# Altium footprint library ST封装.PcbLib: 1336 footprints (part 103 of 109)
Each footprint in its own frame and in the unit in brackets; x right, y up, seen from the top. Pads: shape width x height; smd on the part's side, far side on the other; paste and mask are expansions set on the pad; w line width, h text height; cw(c..) or ccw(c..) is an arc to the next point about the centre after c.
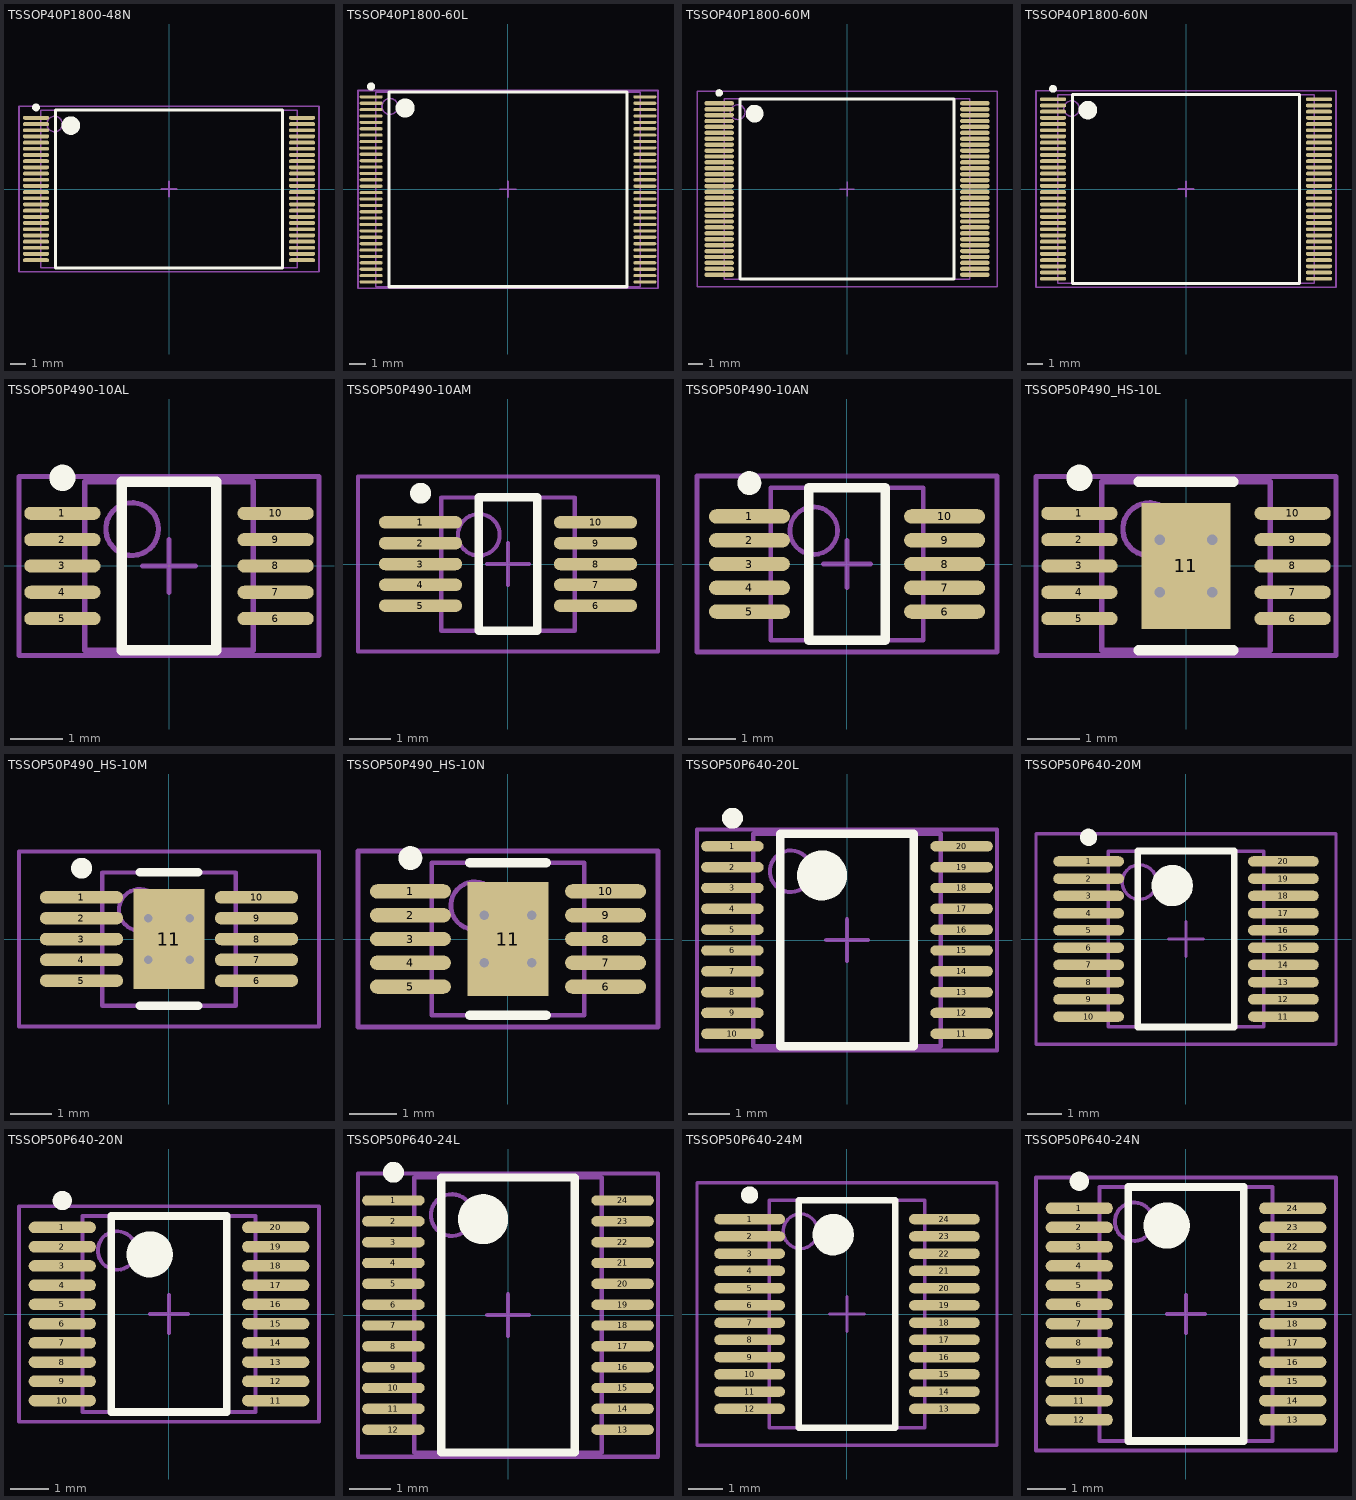
[diagram p102: the footprints below, top view; thin cyan lines are the x and y axes]

## TSSOP40P1800-48N [mm] "TSSOP, 48-Leads, Body 10x16.4mm, Pitch 0.4mm, IPC Medium Density"
height 1.27
pads (48):
  oval 1.7x0.25 smd: 1(-8.6,4.6) 2(-8.6,4.2) 3(-8.6,3.8) 4(-8.6,3.4) 5(-8.6,3) 6(-8.6,2.6) 7(-8.6,2.2) 8(-8.6,1.8) 9(-8.6,1.4) 10(-8.6,1) 11(-8.6,0.6) 12(-8.6,0.2) 13(-8.6,-0.2) 14(-8.6,-0.6) 15(-8.6,-1) 16(-8.6,-1.4) 17(-8.6,-1.8) 18(-8.6,-2.2) 19(-8.6,-2.6) 20(-8.6,-3) 21(-8.6,-3.4) 22(-8.6,-3.8) 23(-8.6,-4.2) 24(-8.6,-4.6) 25(8.6,-4.6) 26(8.6,-4.2) 27(8.6,-3.8) 28(8.6,-3.4) 29(8.6,-3) 30(8.6,-2.6) 31(8.6,-2.2) 32(8.6,-1.8) 33(8.6,-1.4) 34(8.6,-1) 35(8.6,-0.6) 36(8.6,-0.2) 37(8.6,0.2) 38(8.6,0.6) 39(8.6,1) 40(8.6,1.4) 41(8.6,1.8) 42(8.6,2.2) 43(8.6,2.6) 44(8.6,3) 45(8.6,3.4) 46(8.6,3.8) 47(8.6,4.2) 48(8.6,4.6)
Top Overlay:
  circle w0.6: c-6.35,4.1 r0.3
  circle w0.25: c-8.6,5.275 r0.125
  lines w0.2: -7.35,-5.1 7.35,-5.1 7.35,5.1 -7.35,5.1 -7.35,-5.1
Mechanical 13:
  circle w0.1: c-7.4,4.2 r0.5
  lines w0.1: -8.3,-5.1 8.3,-5.1 8.3,5.1 -8.3,5.1 -8.3,-5.1
Mechanical 15:
  lines w0.1: -0.5,0 0.5,0 ; 0,-0.5 0,0.5 ; -9.7,-5.35 9.7,-5.35 9.7,5.35 -9.7,5.35 -9.7,-5.35
3D body: height 1.27, standoff 0, extent -8.3,-5.1 8.3,5.1

## TSSOP40P1800-60L [mm] "TSSOP, 60-Leads, Body 12x16.4mm, Pitch 0.4mm, IPC High Density"
height 1.27
pads (60):
  oval 1.45x0.2 smd: 1(-8.575,5.8) 2(-8.575,5.4) 3(-8.575,5) 4(-8.575,4.6) 5(-8.575,4.2) 6(-8.575,3.8) 7(-8.575,3.4) 8(-8.575,3) 9(-8.575,2.6) 10(-8.575,2.2) 11(-8.575,1.8) 12(-8.575,1.4) 13(-8.575,1) 14(-8.575,0.6) 15(-8.575,0.2) 16(-8.575,-0.2) 17(-8.575,-0.6) 18(-8.575,-1) 19(-8.575,-1.4) 20(-8.575,-1.8) 21(-8.575,-2.2) 22(-8.575,-2.6) 23(-8.575,-3) 24(-8.575,-3.4) 25(-8.575,-3.8) 26(-8.575,-4.2) 27(-8.575,-4.6) 28(-8.575,-5) 29(-8.575,-5.4) 30(-8.575,-5.8) 31(8.575,-5.8) 32(8.575,-5.4) 33(8.575,-5) 34(8.575,-4.6) 35(8.575,-4.2) 36(8.575,-3.8) 37(8.575,-3.4) 38(8.575,-3) 39(8.575,-2.6) 40(8.575,-2.2) 41(8.575,-1.8) 42(8.575,-1.4) 43(8.575,-1) 44(8.575,-0.6) 45(8.575,-0.2) 46(8.575,0.2) 47(8.575,0.6) 48(8.575,1) 49(8.575,1.4) 50(8.575,1.8) 51(8.575,2.2) 52(8.575,2.6) 53(8.575,3) 54(8.575,3.4) 55(8.575,3.8) 56(8.575,4.2) 57(8.575,4.6) 58(8.575,5) 59(8.575,5.4) 60(8.575,5.8)
Top Overlay:
  circle w0.25: c-8.575,6.45 r0.125
  circle w0.6: c-6.45,5.1 r0.3
  lines w0.2: -7.45,-6.1 -7.45,6.1 7.45,6.1 7.45,-6.1 -7.45,-6.1
Mechanical 13:
  circle w0.1: c-7.4,5.2 r0.5
  lines w0.1: -8.3,-6.1 -8.3,6.1 8.3,6.1 8.3,-6.1 -8.3,-6.1
Mechanical 15:
  lines w0.1: -0.5,0 0.5,0 ; 0,-0.5 0,0.5 ; -9.4,-6.2 -9.4,6.2 9.4,6.2 9.4,-6.2 -9.4,-6.2
3D body: height 1.27, standoff 0, extent -8.3,-6.1 8.3,6.1

## TSSOP40P1800-60M [mm] "TSSOP, 60-Leads, Body 12x16.4mm, Pitch 0.4mm, IPC Low Density"
height 1.27
pads (60):
  oval 2x0.3 smd: 1(-8.65,5.8) 2(-8.65,5.4) 3(-8.65,5) 4(-8.65,4.6) 5(-8.65,4.2) 6(-8.65,3.8) 7(-8.65,3.4) 8(-8.65,3) 9(-8.65,2.6) 10(-8.65,2.2) 11(-8.65,1.8) 12(-8.65,1.4) 13(-8.65,1) 14(-8.65,0.6) 15(-8.65,0.2) 16(-8.65,-0.2) 17(-8.65,-0.6) 18(-8.65,-1) 19(-8.65,-1.4) 20(-8.65,-1.8) 21(-8.65,-2.2) 22(-8.65,-2.6) 23(-8.65,-3) 24(-8.65,-3.4) 25(-8.65,-3.8) 26(-8.65,-4.2) 27(-8.65,-4.6) 28(-8.65,-5) 29(-8.65,-5.4) 30(-8.65,-5.8) 31(8.65,-5.8) 32(8.65,-5.4) 33(8.65,-5) 34(8.65,-4.6) 35(8.65,-4.2) 36(8.65,-3.8) 37(8.65,-3.4) 38(8.65,-3) 39(8.65,-2.6) 40(8.65,-2.2) 41(8.65,-1.8) 42(8.65,-1.4) 43(8.65,-1) 44(8.65,-0.6) 45(8.65,-0.2) 46(8.65,0.2) 47(8.65,0.6) 48(8.65,1) 49(8.65,1.4) 50(8.65,1.8) 51(8.65,2.2) 52(8.65,2.6) 53(8.65,3) 54(8.65,3.4) 55(8.65,3.8) 56(8.65,4.2) 57(8.65,4.6) 58(8.65,5) 59(8.65,5.4) 60(8.65,5.8)
Top Overlay:
  circle w0.25: c-8.65,6.5 r0.125
  circle w0.6: c-6.25,5.1 r0.3
  lines w0.2: -7.25,-6.1 -7.25,6.1 7.25,6.1 7.25,-6.1 -7.25,-6.1
Mechanical 13:
  circle w0.1: c-7.4,5.2 r0.5
  lines w0.1: -8.3,-6.1 -8.3,6.1 8.3,6.1 8.3,-6.1 -8.3,-6.1
Mechanical 15:
  lines w0.1: -0.5,0 0.5,0 ; 0,-0.5 0,0.5 ; -10.15,-6.6 -10.15,6.6 10.15,6.6 10.15,-6.6 -10.15,-6.6
3D body: height 1.27, standoff 0, extent -8.3,-6.1 8.3,6.1

## TSSOP40P1800-60N [mm] "TSSOP, 60-Leads, Body 12x16.4mm, Pitch 0.4mm, IPC Medium Density"
height 1.27
pads (60):
  oval 1.7x0.25 smd: 1(-8.6,5.8) 2(-8.6,5.4) 3(-8.6,5) 4(-8.6,4.6) 5(-8.6,4.2) 6(-8.6,3.8) 7(-8.6,3.4) 8(-8.6,3) 9(-8.6,2.6) 10(-8.6,2.2) 11(-8.6,1.8) 12(-8.6,1.4) 13(-8.6,1) 14(-8.6,0.6) 15(-8.6,0.2) 16(-8.6,-0.2) 17(-8.6,-0.6) 18(-8.6,-1) 19(-8.6,-1.4) 20(-8.6,-1.8) 21(-8.6,-2.2) 22(-8.6,-2.6) 23(-8.6,-3) 24(-8.6,-3.4) 25(-8.6,-3.8) 26(-8.6,-4.2) 27(-8.6,-4.6) 28(-8.6,-5) 29(-8.6,-5.4) 30(-8.6,-5.8) 31(8.6,-5.8) 32(8.6,-5.4) 33(8.6,-5) 34(8.6,-4.6) 35(8.6,-4.2) 36(8.6,-3.8) 37(8.6,-3.4) 38(8.6,-3) 39(8.6,-2.6) 40(8.6,-2.2) 41(8.6,-1.8) 42(8.6,-1.4) 43(8.6,-1) 44(8.6,-0.6) 45(8.6,-0.2) 46(8.6,0.2) 47(8.6,0.6) 48(8.6,1) 49(8.6,1.4) 50(8.6,1.8) 51(8.6,2.2) 52(8.6,2.6) 53(8.6,3) 54(8.6,3.4) 55(8.6,3.8) 56(8.6,4.2) 57(8.6,4.6) 58(8.6,5) 59(8.6,5.4) 60(8.6,5.8)
Top Overlay:
  circle w0.25: c-8.6,6.475 r0.125
  circle w0.6: c-6.35,5.1 r0.3
  lines w0.2: -7.35,-6.1 -7.35,6.1 7.35,6.1 7.35,-6.1 -7.35,-6.1
Mechanical 13:
  circle w0.1: c-7.4,5.2 r0.5
  lines w0.1: -8.3,-6.1 -8.3,6.1 8.3,6.1 8.3,-6.1 -8.3,-6.1
Mechanical 15:
  lines w0.1: -0.5,0 0.5,0 ; 0,-0.5 0,0.5 ; -9.7,-6.35 -9.7,6.35 9.7,6.35 9.7,-6.35 -9.7,-6.35
3D body: height 1.27, standoff 0, extent -8.3,-6.1 8.3,6.1

## TSSOP50P490-10AL [mm] "TSSOP, 10-Leads, Body 3x3mm, Pitch 0.5mm, IPC High Density"
height 1.1
pads (10):
  oval 1.45x0.25 smd: 1(-2.025,1) 2(-2.025,0.5) 3(-2.025,0) 4(-2.025,-0.5) 5(-2.025,-1) 6(2.025,-1) 7(2.025,-0.5) 8(2.025,0) 9(2.025,0.5) 10(2.025,1)
Top Overlay:
  circle w0.25: c-2.025,1.675 r0.125
  lines w0.2: -0.9,-1.6 0.9,-1.6 0.9,1.6 -0.9,1.6 -0.9,-1.6
Mechanical 13:
  circle w0.1: c-0.7,0.7 r0.5
  lines w0.1: -1.6,-1.6 1.6,-1.6 1.6,1.6 -1.6,1.6 -1.6,-1.6
Mechanical 15:
  lines w0.1: -0.5,0 0.5,0 ; 0,-0.5 0,0.5 ; -2.85,-1.7 2.85,-1.7 2.85,1.7 -2.85,1.7 -2.85,-1.7
3D body: height 1.1, standoff 0, extent -1.6,-1.6 1.6,1.6

## TSSOP50P490-10AM [mm] "TSSOP, 10-Leads, Body 3x3mm, Pitch 0.5mm, IPC Low Density"
height 1.1
pads (10):
  oval 2x0.3 smd: 1(-2.1,1) 2(-2.1,0.5) 3(-2.1,0) 4(-2.1,-0.5) 5(-2.1,-1) 6(2.1,-1) 7(2.1,-0.5) 8(2.1,0) 9(2.1,0.5) 10(2.1,1)
Top Overlay:
  circle w0.25: c-2.1,1.7 r0.125
  lines w0.2: -0.7,-1.6 -0.7,1.6 0.7,1.6 0.7,-1.6 -0.7,-1.6
Mechanical 13:
  circle w0.1: c-0.7,0.7 r0.5
  lines w0.1: -1.6,-1.6 -1.6,1.6 1.6,1.6 1.6,-1.6 -1.6,-1.6
Mechanical 15:
  lines w0.1: -0.5,0 0.5,0 ; 0,-0.5 0,0.5 ; -3.6,-2.1 -3.6,2.1 3.6,2.1 3.6,-2.1 -3.6,-2.1
3D body: height 1.1, standoff 0, extent -1.6,-1.6 1.6,1.6

## TSSOP50P490-10AN [mm] "TSSOP, 10-Leads, Body 3x3mm, Pitch 0.5mm, IPC Medium Density"
height 1.1
pads (10):
  oval 1.7x0.3 smd: 1(-2.05,1) 2(-2.05,0.5) 3(-2.05,0) 4(-2.05,-0.5) 5(-2.05,-1) 6(2.05,-1) 7(2.05,-0.5) 8(2.05,0) 9(2.05,0.5) 10(2.05,1)
Top Overlay:
  circle w0.25: c-2.05,1.7 r0.125
  lines w0.2: -0.8,-1.6 -0.8,1.6 0.8,1.6 0.8,-1.6 -0.8,-1.6
Mechanical 13:
  circle w0.1: c-0.7,0.7 r0.5
  lines w0.1: -1.6,-1.6 -1.6,1.6 1.6,1.6 1.6,-1.6 -1.6,-1.6
Mechanical 15:
  lines w0.1: -0.5,0 0.5,0 ; 0,-0.5 0,0.5 ; -3.15,-1.85 -3.15,1.85 3.15,1.85 3.15,-1.85 -3.15,-1.85
3D body: height 1.1, standoff 0, extent -1.6,-1.6 1.6,1.6

## TSSOP50P490_HS-10L [mm] "TSSOP, 10-Leads, Body 3x3mm, Pitch 0.5mm, Exposed Pad, IPC High Density"
height 1.1
pads (11):
  oval 1.45x0.25 smd: 1(-2.025,1) 2(-2.025,0.5) 3(-2.025,0) 4(-2.025,-0.5) 5(-2.025,-1) 6(2.025,-1) 7(2.025,-0.5) 8(2.025,0) 9(2.025,0.5) 10(2.025,1)
  rect 1.7x2.4 smd: 11(0,0)
via -0.5,0.5 diameter 0.4 hole 0.2
via 0.5,0.5 diameter 0.4 hole 0.2
via -0.5,-0.5 diameter 0.4 hole 0.2
via 0.5,-0.5 diameter 0.4 hole 0.2
Top Overlay:
  circle w0.25: c-2.025,1.675 r0.125
  lines w0.2: -0.9,-1.6 0.9,-1.6 ; -0.9,1.6 0.9,1.6
Mechanical 13:
  circle w0.1: c-0.7,0.7 r0.5
  lines w0.1: -1.6,-1.6 -1.6,1.6 1.6,1.6 1.6,-1.6 -1.6,-1.6
Mechanical 15:
  lines w0.1: -0.5,0 0.5,0 ; 0,-0.5 0,0.5 ; -2.85,-1.7 -2.85,1.7 2.85,1.7 2.85,-1.7 -2.85,-1.7
3D body: height 1.1, standoff 0.05, extent -1.6,-1.6 1.6,1.6

## TSSOP50P490_HS-10M [mm] "TSSOP, 10-Leads, Body 3x3mm, Pitch 0.5mm, Exposed Pad, IPC Low Density"
height 1.1
pads (11):
  oval 2x0.3 smd: 1(-2.1,1) 2(-2.1,0.5) 3(-2.1,0) 4(-2.1,-0.5) 5(-2.1,-1) 6(2.1,-1) 7(2.1,-0.5) 8(2.1,0) 9(2.1,0.5) 10(2.1,1)
  rect 1.7x2.4 smd: 11(0,0)
via -0.5,0.5 diameter 0.4 hole 0.2
via 0.5,0.5 diameter 0.4 hole 0.2
via -0.5,-0.5 diameter 0.4 hole 0.2
via 0.5,-0.5 diameter 0.4 hole 0.2
Top Overlay:
  circle w0.25: c-2.1,1.7 r0.125
  lines w0.2: -0.7,-1.6 0.7,-1.6 ; -0.7,1.6 0.7,1.6
Mechanical 13:
  circle w0.1: c-0.7,0.7 r0.5
  lines w0.1: -1.6,-1.6 1.6,-1.6 1.6,1.6 -1.6,1.6 -1.6,-1.6
Mechanical 15:
  lines w0.1: -0.5,0 0.5,0 ; 0,-0.5 0,0.5 ; -3.6,-2.1 3.6,-2.1 3.6,2.1 -3.6,2.1 -3.6,-2.1
3D body: height 1.1, standoff 0.05, extent -1.6,-1.6 1.6,1.6

## TSSOP50P490_HS-10N [mm] "TSSOP, 10-Leads, Body 3x3mm, Pitch 0.5mm, Exposed Pad, IPC Medium Density"
height 1.1
pads (11):
  oval 1.7x0.3 smd: 1(-2.05,1) 2(-2.05,0.5) 3(-2.05,0) 4(-2.05,-0.5) 5(-2.05,-1) 6(2.05,-1) 7(2.05,-0.5) 8(2.05,0) 9(2.05,0.5) 10(2.05,1)
  rect 1.7x2.4 smd: 11(0,0)
via -0.5,0.5 diameter 0.4 hole 0.2
via 0.5,0.5 diameter 0.4 hole 0.2
via -0.5,-0.5 diameter 0.4 hole 0.2
via 0.5,-0.5 diameter 0.4 hole 0.2
Top Overlay:
  circle w0.25: c-2.05,1.7 r0.125
  lines w0.2: -0.8,-1.6 0.8,-1.6 ; -0.8,1.6 0.8,1.6
Mechanical 13:
  circle w0.1: c-0.7,0.7 r0.5
  lines w0.1: -1.6,-1.6 -1.6,1.6 1.6,1.6 1.6,-1.6 -1.6,-1.6
Mechanical 15:
  lines w0.1: -0.5,0 0.5,0 ; 0,-0.5 0,0.5 ; -3.15,-1.85 -3.15,1.85 3.15,1.85 3.15,-1.85 -3.15,-1.85
3D body: height 1.1, standoff 0.05, extent -1.6,-1.6 1.6,1.6

## TSSOP50P640-20L [mm] "TSSOP, 20-Leads, Body 5x4.4mm, Pitch 0.5mm, IPC High Density"
height 1.2
pads (20):
  oval 1.5x0.25 smd: 1(-2.75,2.25) 2(-2.75,1.75) 3(-2.75,1.25) 4(-2.75,0.75) 5(-2.75,0.25) 6(-2.75,-0.25) 7(-2.75,-0.75) 8(-2.75,-1.25) 9(-2.75,-1.75) 10(-2.75,-2.25) 11(2.75,-2.25) 12(2.75,-1.75) 13(2.75,-1.25) 14(2.75,-0.75) 15(2.75,-0.25) 16(2.75,0.25) 17(2.75,0.75) 18(2.75,1.25) 19(2.75,1.75) 20(2.75,2.25)
Top Overlay:
  circle w0.25: c-2.75,2.925 r0.125
  circle w0.6: c-0.6,1.55 r0.3
  lines w0.2: -1.6,-2.55 -1.6,2.55 1.6,2.55 1.6,-2.55 -1.6,-2.55
Mechanical 13:
  circle w0.1: c-1.35,1.65 r0.5
  lines w0.1: -2.25,-2.55 -2.25,2.55 2.25,2.55 2.25,-2.55 -2.25,-2.55
Mechanical 15:
  lines w0.1: -0.5,0 0.5,0 ; 0,-0.5 0,0.5 ; -3.6,-2.65 -3.6,2.65 3.6,2.65 3.6,-2.65 -3.6,-2.65
3D body: height 1.2, standoff 0, extent -2.25,-2.55 2.25,2.55

## TSSOP50P640-20M [mm] "TSSOP, 20-Leads, Body 5x4.4mm, Pitch 0.5mm, IPC Low Density"
height 1.2
pads (20):
  oval 2.05x0.3 smd: 1(-2.825,2.25) 2(-2.825,1.75) 3(-2.825,1.25) 4(-2.825,0.75) 5(-2.825,0.25) 6(-2.825,-0.25) 7(-2.825,-0.75) 8(-2.825,-1.25) 9(-2.825,-1.75) 10(-2.825,-2.25) 11(2.825,-2.25) 12(2.825,-1.75) 13(2.825,-1.25) 14(2.825,-0.75) 15(2.825,-0.25) 16(2.825,0.25) 17(2.825,0.75) 18(2.825,1.25) 19(2.825,1.75) 20(2.825,2.25)
Top Overlay:
  circle w0.25: c-2.825,2.95 r0.125
  circle w0.6: c-0.4,1.55 r0.3
  lines w0.2: -1.4,-2.55 -1.4,2.55 1.4,2.55 1.4,-2.55 -1.4,-2.55
Mechanical 13:
  circle w0.1: c-1.35,1.65 r0.5
  lines w0.1: -2.25,-2.55 -2.25,2.55 2.25,2.55 2.25,-2.55 -2.25,-2.55
Mechanical 15:
  lines w0.1: -0.5,0 0.5,0 ; 0,-0.5 0,0.5 ; -4.35,-3.05 -4.35,3.05 4.35,3.05 4.35,-3.05 -4.35,-3.05
3D body: height 1.2, standoff 0, extent -2.25,-2.55 2.25,2.55

## TSSOP50P640-20N [mm] "TSSOP, 20-Leads, Body 5x4.4mm, Pitch 0.5mm, IPC Medium Density"
height 1.2
pads (20):
  oval 1.75x0.3 smd: 1(-2.775,2.25) 2(-2.775,1.75) 3(-2.775,1.25) 4(-2.775,0.75) 5(-2.775,0.25) 6(-2.775,-0.25) 7(-2.775,-0.75) 8(-2.775,-1.25) 9(-2.775,-1.75) 10(-2.775,-2.25) 11(2.775,-2.25) 12(2.775,-1.75) 13(2.775,-1.25) 14(2.775,-0.75) 15(2.775,-0.25) 16(2.775,0.25) 17(2.775,0.75) 18(2.775,1.25) 19(2.775,1.75) 20(2.775,2.25)
Top Overlay:
  circle w0.25: c-2.775,2.95 r0.125
  circle w0.6: c-0.5,1.55 r0.3
  lines w0.2: -1.5,-2.55 -1.5,2.55 1.5,2.55 1.5,-2.55 -1.5,-2.55
Mechanical 13:
  circle w0.1: c-1.35,1.65 r0.5
  lines w0.1: -2.25,-2.55 -2.25,2.55 2.25,2.55 2.25,-2.55 -2.25,-2.55
Mechanical 15:
  lines w0.1: -0.5,0 0.5,0 ; 0,-0.5 0,0.5 ; -3.9,-2.8 -3.9,2.8 3.9,2.8 3.9,-2.8 -3.9,-2.8
3D body: height 1.2, standoff 0, extent -2.25,-2.55 2.25,2.55

## TSSOP50P640-24L [mm] "TSSOP, 24-Leads, Body 6.5x4.4mm, Pitch 0.5mm, IPC High Density"
height 1.2
pads (24):
  oval 1.5x0.25 smd: 1(-2.75,2.75) 2(-2.75,2.25) 3(-2.75,1.75) 4(-2.75,1.25) 5(-2.75,0.75) 6(-2.75,0.25) 7(-2.75,-0.25) 8(-2.75,-0.75) 9(-2.75,-1.25) 10(-2.75,-1.75) 11(-2.75,-2.25) 12(-2.75,-2.75) 13(2.75,-2.75) 14(2.75,-2.25) 15(2.75,-1.75) 16(2.75,-1.25) 17(2.75,-0.75) 18(2.75,-0.25) 19(2.75,0.25) 20(2.75,0.75) 21(2.75,1.25) 22(2.75,1.75) 23(2.75,2.25) 24(2.75,2.75)
Top Overlay:
  circle w0.6: c-0.6,2.3 r0.3
  circle w0.25: c-2.75,3.425 r0.125
  lines w0.2: -1.6,-3.3 1.6,-3.3 1.6,3.3 -1.6,3.3 -1.6,-3.3
Mechanical 13:
  circle w0.1: c-1.35,2.4 r0.5
  lines w0.1: -2.25,-3.3 2.25,-3.3 2.25,3.3 -2.25,3.3 -2.25,-3.3
Mechanical 15:
  lines w0.1: -0.5,0 0.5,0 ; 0,-0.5 0,0.5 ; -3.6,-3.4 3.6,-3.4 3.6,3.4 -3.6,3.4 -3.6,-3.4
3D body: height 1.2, standoff 0, extent -2.25,-3.3 2.25,3.3

## TSSOP50P640-24M [mm] "TSSOP, 24-Leads, Body 6.5x4.4mm, Pitch 0.5mm, IPC Low Density"
height 1.2
pads (24):
  oval 2.05x0.3 smd: 1(-2.825,2.75) 2(-2.825,2.25) 3(-2.825,1.75) 4(-2.825,1.25) 5(-2.825,0.75) 6(-2.825,0.25) 7(-2.825,-0.25) 8(-2.825,-0.75) 9(-2.825,-1.25) 10(-2.825,-1.75) 11(-2.825,-2.25) 12(-2.825,-2.75) 13(2.825,-2.75) 14(2.825,-2.25) 15(2.825,-1.75) 16(2.825,-1.25) 17(2.825,-0.75) 18(2.825,-0.25) 19(2.825,0.25) 20(2.825,0.75) 21(2.825,1.25) 22(2.825,1.75) 23(2.825,2.25) 24(2.825,2.75)
Top Overlay:
  circle w0.6: c-0.4,2.3 r0.3
  circle w0.25: c-2.825,3.45 r0.125
  lines w0.2: -1.4,-3.3 1.4,-3.3 1.4,3.3 -1.4,3.3 -1.4,-3.3
Mechanical 13:
  circle w0.1: c-1.35,2.4 r0.5
  lines w0.1: -2.25,-3.3 2.25,-3.3 2.25,3.3 -2.25,3.3 -2.25,-3.3
Mechanical 15:
  lines w0.1: -0.5,0 0.5,0 ; 0,-0.5 0,0.5 ; -4.35,-3.8 4.35,-3.8 4.35,3.8 -4.35,3.8 -4.35,-3.8
3D body: height 1.2, standoff 0, extent -2.25,-3.3 2.25,3.3

## TSSOP50P640-24N [mm] "TSSOP, 24-Leads, Body 6.5x4.4mm, Pitch 0.5mm, IPC Medium Density"
height 1.2
pads (24):
  oval 1.75x0.3 smd: 1(-2.775,2.75) 2(-2.775,2.25) 3(-2.775,1.75) 4(-2.775,1.25) 5(-2.775,0.75) 6(-2.775,0.25) 7(-2.775,-0.25) 8(-2.775,-0.75) 9(-2.775,-1.25) 10(-2.775,-1.75) 11(-2.775,-2.25) 12(-2.775,-2.75) 13(2.775,-2.75) 14(2.775,-2.25) 15(2.775,-1.75) 16(2.775,-1.25) 17(2.775,-0.75) 18(2.775,-0.25) 19(2.775,0.25) 20(2.775,0.75) 21(2.775,1.25) 22(2.775,1.75) 23(2.775,2.25) 24(2.775,2.75)
Top Overlay:
  circle w0.25: c-2.775,3.45 r0.125
  circle w0.6: c-0.5,2.3 r0.3
  lines w0.2: -1.5,-3.3 -1.5,3.3 1.5,3.3 1.5,-3.3 -1.5,-3.3
Mechanical 13:
  circle w0.1: c-1.35,2.4 r0.5
  lines w0.1: -2.25,-3.3 -2.25,3.3 2.25,3.3 2.25,-3.3 -2.25,-3.3
Mechanical 15:
  lines w0.1: -0.5,0 0.5,0 ; 0,-0.5 0,0.5 ; -3.9,-3.55 -3.9,3.55 3.9,3.55 3.9,-3.55 -3.9,-3.55
3D body: height 1.2, standoff 0, extent -2.25,-3.3 2.25,3.3